# Altium footprint library 6-Connectors-3.PcbLib: 153 footprints (part 7 of 11)
Each footprint in its own frame and in the unit in brackets; x right, y up, seen from the top. Pads: shape width x height; smd on the part's side, far side on the other; paste and mask are expansions set on the pad; w line width, h text height; cw(c..) or ccw(c..) is an arc to the next point about the centre after c.
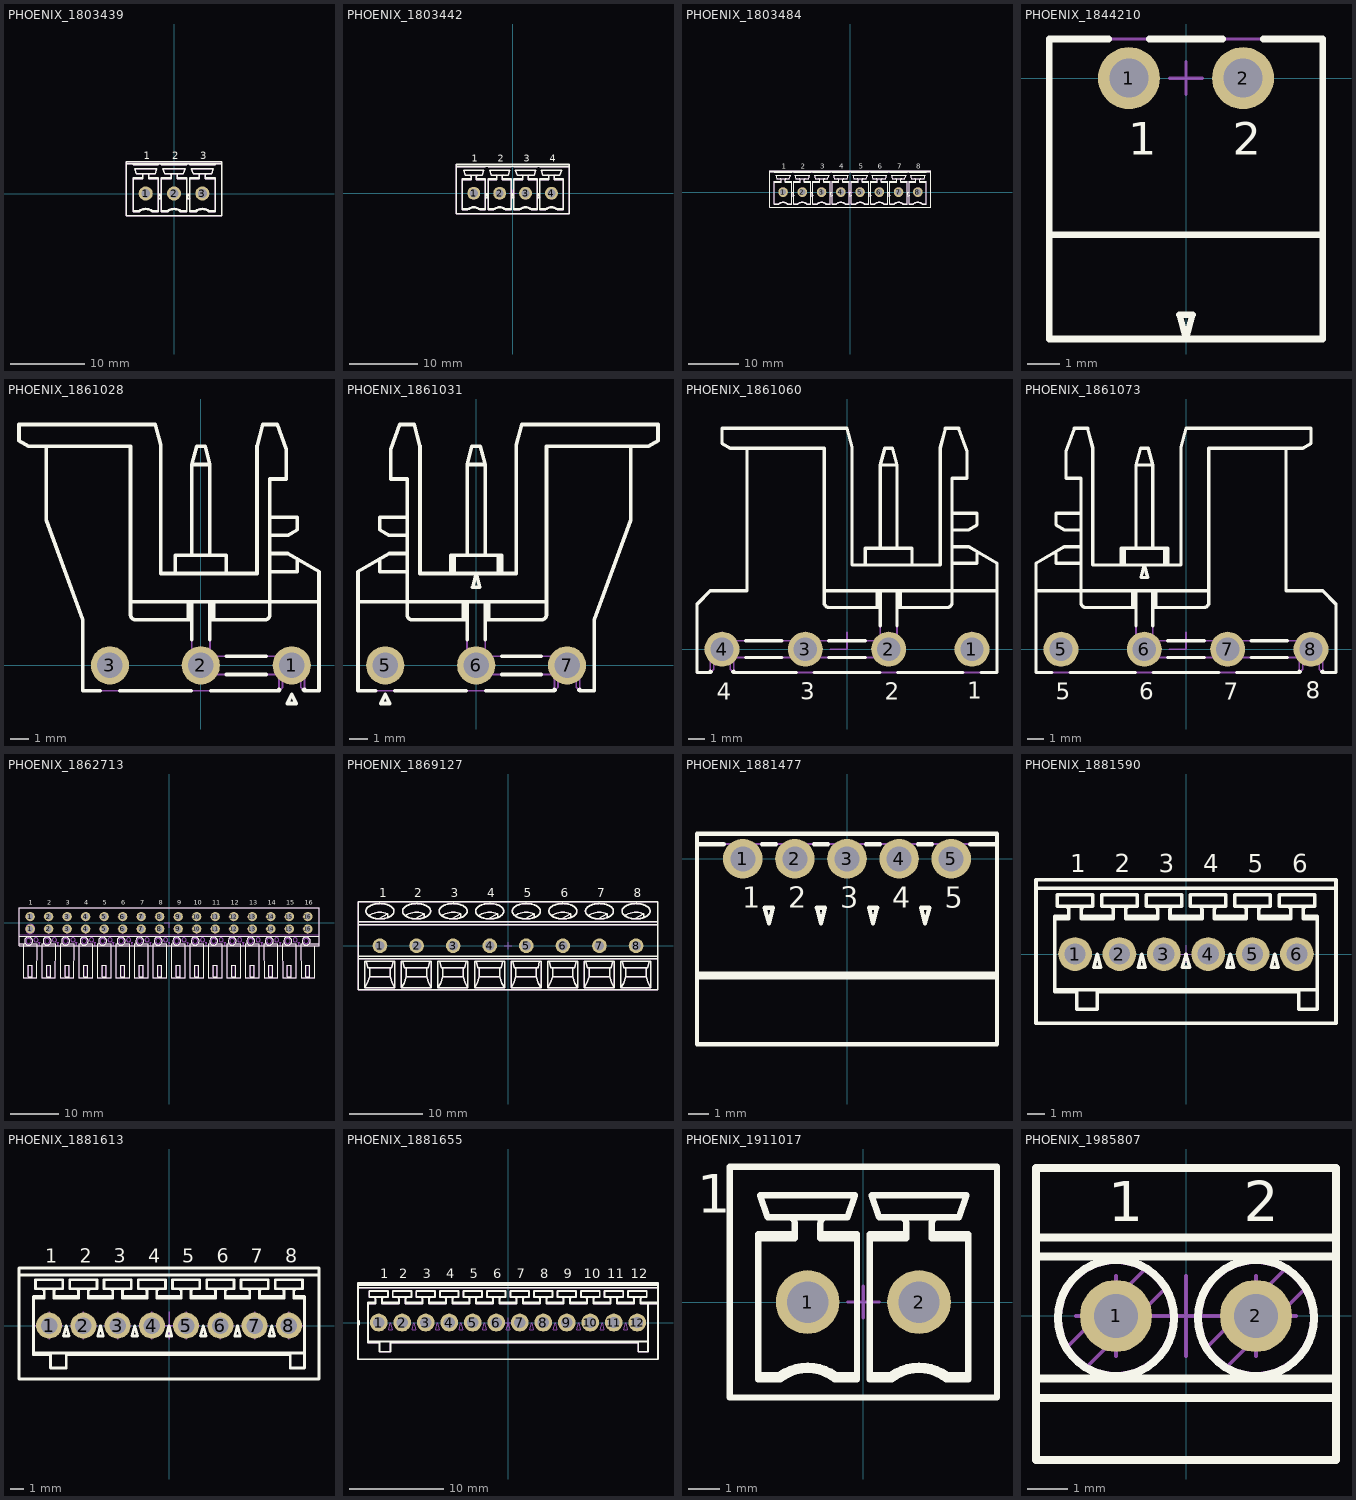
[diagram p6: the footprints below, top view; thin cyan lines are the x and y axes]

## PHOENIX_1803439 [mm] "PCB Header, 8A, 160 V, Pitch: 3.81mm, 3 Positions, MCV Serie"
height 9.2
pads (3):
  round 1.9 hole 1.2: 1(-3.81,0) 2(0,0) 3(3.81,0)
Top Overlay:
  lines w0.2: -6.41,4 6.41,4 ; -5.515,-2.3 -4.71,-2.3 ; -5.515,2 -4.21,2 -4.21,2.47 ccw(c-4.41,2.47) -4.41,2.67 ; -5.513,3.9 -5.514,3.9 ; -5.513,4 -5.514,4 -5.514,3.9 ; -4.21,2.134 -5.515,2.134 -5.515,-2.434 -4.664,-2.434 ; -3.41,2.134 -2.105,2.134 -2.105,-2.434 -2.956,-2.434 ; -3.21,2.67 ccw(c-3.21,2.47) -3.41,2.47 -3.41,2 -2.105,2 ; -2.106,4 -2.105,4 -2.105,3.9 -2.106,3.9 -5.514,3.9 ; -2.105,-2.3 -2.91,-2.3 ; -1.705,-2.3 -0.9,-2.3 ; -1.705,2 -0.4,2 -0.4,2.47 ccw(c-0.6,2.47) -0.6,2.67 ; -1.703,3.9 -1.704,3.9 ; -1.703,4 -1.704,4 -1.704,3.9 ; -0.4,2.134 -1.705,2.134 -1.705,-2.434 -0.854,-2.434 ; 0.4,2.134 1.705,2.134 1.705,-2.434 0.854,-2.434 ; 0.6,2.67 ccw(c0.6,2.47) 0.4,2.47 0.4,2 1.705,2 ; 1.704,4 1.705,4 1.705,3.9 1.704,3.9 -1.704,3.9 ; 1.705,-2.3 0.9,-2.3 ; 2.105,-2.3 2.91,-2.3 ; 2.105,2 3.41,2 3.41,2.47 ccw(c3.21,2.47) 3.21,2.67 ; 2.107,3.9 2.106,3.9 ; 2.107,4 2.106,4 2.106,3.9 ; 3.41,2.134 2.105,2.134 2.105,-2.434 2.956,-2.434 ; 4.21,2.134 5.515,2.134 5.515,-2.434 4.664,-2.434 ; 4.41,2.67 ccw(c4.41,2.47) 4.21,2.47 4.21,2 5.515,2 ; 5.514,4 5.515,4 5.515,3.9 5.514,3.9 2.106,3.9 ; 5.515,-2.3 4.71,-2.3 ; -4.71,-2.3 cw(c-3.81,-3.5) -2.91,-2.3 ; -4.71,-2.3 -4.699,-2.334 -4.687,-2.367 ccw(c3.361,0.384) -4.664,-2.434 ; -4.664,-2.434 cw(c-3.81,-3.5) -2.956,-2.434 ; -2.956,-2.434 -2.944,-2.401 -2.933,-2.367 ccw(c-11.642,0.61) -2.91,-2.3 ; -0.9,-2.3 cw(c0,-3.5) 0.9,-2.3 ; -0.9,-2.3 -0.889,-2.334 -0.877,-2.367 ccw(c7.171,0.384) -0.854,-2.434 ; -0.854,-2.434 cw(c0,-3.5) 0.854,-2.434 ; 0.854,-2.434 0.866,-2.401 0.877,-2.367 ccw(c-7.832,0.61) 0.9,-2.3 ; 2.91,-2.3 cw(c3.81,-3.5) 4.71,-2.3 ; 2.91,-2.3 2.921,-2.334 2.933,-2.367 ccw(c10.981,0.384) 2.956,-2.434 ; 2.956,-2.434 cw(c3.81,-3.5) 4.664,-2.434 ; 4.664,-2.434 4.676,-2.401 4.687,-2.367 ccw(c-4.022,0.61) 4.71,-2.3 ; -6.41,-3 6.41,-3 6.41,4.25 -6.41,4.25 -6.41,-3 ; -5.3,3.35 -2.32,3.35 -2.555,2.67 -5.065,2.67 -5.3,3.35 ; -2.093,-0.7 -1.717,-0.7 -1.905,0 -2.093,-0.7 ; -1.49,3.35 1.49,3.35 1.255,2.67 -1.255,2.67 -1.49,3.35 ; 1.717,-0.7 2.093,-0.7 1.905,0 1.717,-0.7 ; 2.32,3.35 5.3,3.35 5.065,2.67 2.555,2.67 2.32,3.35
  text "1" at -4.085,4.6 h1
  text "2" at -0.275,4.6 h1
  text "3" at 3.535,4.6 h1
Mechanical 2:
  circle w0.1: c0,0 r0.8
  circle w0.1: c3.81,0 r0.8
Mechanical 8:
  lines w0.1: -4.31,0 -3.81,0 ; -3.81,-0.5 -3.81,0 ; -3.81,0.5 -3.81,0 ; -3.31,0 -3.81,0 ; -0.5,0 0,0 ; 0,-0.5 0,0 ; 0,0.5 0,0 ; 0.5,0 0,0 ; 3.31,0 3.81,0 ; 3.81,-0.5 3.81,0 ; 3.81,0.5 3.81,0 ; 4.31,0 3.81,0
Mechanical 14:
  lines w0.1: -6.41,4 6.41,4 ; -5.515,-2.3 -4.71,-2.3 ; -5.515,2 -4.21,2 -4.21,2.47 ccw(c-4.41,2.47) -4.41,2.67 ; -5.513,3.9 -5.514,3.9 ; -5.513,4 -5.514,4 -5.514,3.9 ; -4.21,2.134 -5.515,2.134 -5.515,-2.434 -4.664,-2.434 ; -3.41,2.134 -2.105,2.134 -2.105,-2.434 -2.956,-2.434 ; -3.21,2.67 ccw(c-3.21,2.47) -3.41,2.47 -3.41,2 -2.105,2 ; -2.106,4 -2.105,4 -2.105,3.9 -2.106,3.9 -5.514,3.9 ; -2.105,-2.3 -2.91,-2.3 ; -1.705,-2.3 -0.9,-2.3 ; -1.705,2 -0.4,2 -0.4,2.47 ccw(c-0.6,2.47) -0.6,2.67 ; -1.703,3.9 -1.704,3.9 ; -1.703,4 -1.704,4 -1.704,3.9 ; -0.4,2.134 -1.705,2.134 -1.705,-2.434 -0.854,-2.434 ; 0.4,2.134 1.705,2.134 1.705,-2.434 0.854,-2.434 ; 0.6,2.67 ccw(c0.6,2.47) 0.4,2.47 0.4,2 1.705,2 ; 1.704,4 1.705,4 1.705,3.9 1.704,3.9 -1.704,3.9 ; 1.705,-2.3 0.9,-2.3 ; 2.105,-2.3 2.91,-2.3 ; 2.105,2 3.41,2 3.41,2.47 ccw(c3.21,2.47) 3.21,2.67 ; 2.107,3.9 2.106,3.9 ; 2.107,4 2.106,4 2.106,3.9 ; 3.41,2.134 2.105,2.134 2.105,-2.434 2.956,-2.434 ; 4.21,2.134 5.515,2.134 5.515,-2.434 4.664,-2.434 ; 4.41,2.67 ccw(c4.41,2.47) 4.21,2.47 4.21,2 5.515,2 ; 5.514,4 5.515,4 5.515,3.9 5.514,3.9 2.106,3.9 ; 5.515,-2.3 4.71,-2.3 ; -4.71,-2.3 cw(c-3.81,-3.5) -2.91,-2.3 ; -4.71,-2.3 -4.699,-2.334 -4.687,-2.367 ccw(c3.361,0.384) -4.664,-2.434 ; -4.664,-2.434 cw(c-3.81,-3.5) -2.956,-2.434 ; -2.956,-2.434 -2.944,-2.401 -2.933,-2.367 ccw(c-11.642,0.61) -2.91,-2.3 ; -0.9,-2.3 cw(c0,-3.5) 0.9,-2.3 ; -0.9,-2.3 -0.889,-2.334 -0.877,-2.367 ccw(c7.171,0.384) -0.854,-2.434 ; -0.854,-2.434 cw(c0,-3.5) 0.854,-2.434 ; 0.854,-2.434 0.866,-2.401 0.877,-2.367 ccw(c-7.832,0.61) 0.9,-2.3 ; 2.91,-2.3 cw(c3.81,-3.5) 4.71,-2.3 ; 2.91,-2.3 2.921,-2.334 2.933,-2.367 ccw(c10.981,0.384) 2.956,-2.434 ; 2.956,-2.434 cw(c3.81,-3.5) 4.664,-2.434 ; 4.664,-2.434 4.676,-2.401 4.687,-2.367 ccw(c-4.022,0.61) 4.71,-2.3 ; -6.41,-3 6.41,-3 6.41,4.25 -6.41,4.25 -6.41,-3 ; -5.3,3.35 -2.32,3.35 -2.555,2.67 -5.065,2.67 -5.3,3.35 ; -4.31,-0.625 ccw(c-3.81,0) -4.31,0.625 -4.31,-0.624 ; -4.21,-0.4 -4.21,0.4 -3.41,0.4 -3.41,-0.4 -4.21,-0.4 ; -2.093,-0.7 -1.717,-0.7 -1.905,0 -2.093,-0.7 ; -1.49,3.35 1.49,3.35 1.255,2.67 -1.255,2.67 -1.49,3.35 ; -0.4,-0.4 -0.4,0.4 0.4,0.4 0.4,-0.4 -0.4,-0.4 ; 1.717,-0.7 2.093,-0.7 1.905,0 1.717,-0.7 ; 2.32,3.35 5.3,3.35 5.065,2.67 2.555,2.67 2.32,3.35 ; 3.41,-0.4 3.41,0.4 4.21,0.4 4.21,-0.4 3.41,-0.4
3D body "PHOENIX_1803439.stp": height 9.2, standoff -3.4, extent -6.41,-3 6.41,4.25

## PHOENIX_1803442 [mm] "PCB Header, 8A, 160 V, Pitch: 3.81mm, 4 Positions, MCV Serie"
height 9.2
pads (4):
  round 1.9 hole 1.2: 1(-5.715,0) 2(-1.905,0) 3(1.905,0) 4(5.715,0)
Top Overlay:
  lines w0.2: -8.315,3.9 -4.011,3.9 -4.01,3.9 -4.01,4 -4.011,4 ; -8.315,4 8.315,4 ; -7.42,-2.3 -6.615,-2.3 ; -7.42,2 -6.115,2 -6.115,2.47 ccw(c-6.315,2.47) -6.315,2.67 ; -6.115,2.134 -7.42,2.134 -7.42,-2.434 -6.569,-2.434 ; -5.315,2.134 -4.01,2.134 -4.01,-2.434 -4.861,-2.434 ; -5.115,2.67 ccw(c-5.115,2.47) -5.315,2.47 -5.315,2 -4.01,2 ; -4.01,-2.3 -4.815,-2.3 ; -3.61,-2.3 -2.805,-2.3 ; -3.61,2 -2.305,2 -2.305,2.47 ccw(c-2.505,2.47) -2.505,2.67 ; -3.609,4 -3.61,4 -3.61,3.9 -3.609,3.9 -0.201,3.9 -0.2,3.9 -0.2,4 -0.201,4 ; -2.305,2.134 -3.61,2.134 -3.61,-2.434 -2.759,-2.434 ; -1.505,2.134 -0.2,2.134 -0.2,-2.434 -1.051,-2.434 ; -1.305,2.67 ccw(c-1.305,2.47) -1.505,2.47 -1.505,2 -0.2,2 ; -0.2,-2.3 -1.005,-2.3 ; 0.2,-2.3 1.005,-2.3 ; 0.2,2 1.505,2 1.505,2.47 ccw(c1.305,2.47) 1.305,2.67 ; 0.201,4 0.2,4 0.2,3.9 0.201,3.9 3.609,3.9 3.61,3.9 3.61,4 3.609,4 ; 1.505,2.134 0.2,2.134 0.2,-2.434 1.051,-2.434 ; 2.305,2.134 3.61,2.134 3.61,-2.434 2.759,-2.434 ; 2.505,2.67 ccw(c2.505,2.47) 2.305,2.47 2.305,2 3.61,2 ; 3.61,-2.3 2.805,-2.3 ; 4.01,-2.3 4.815,-2.3 ; 4.01,2 5.315,2 5.315,2.47 ccw(c5.115,2.47) 5.115,2.67 ; 4.011,4 4.01,4 4.01,3.9 4.011,3.9 8.315,3.9 ; 5.315,2.134 4.01,2.134 4.01,-2.434 4.861,-2.434 ; 6.115,2.134 7.42,2.134 7.42,-2.434 6.569,-2.434 ; 6.315,2.67 ccw(c6.315,2.47) 6.115,2.47 6.115,2 7.42,2 ; 7.42,-2.3 6.615,-2.3 ; -6.615,-2.3 cw(c-5.715,-3.5) -4.815,-2.3 ; -6.615,-2.3 -6.604,-2.334 -6.592,-2.367 ccw(c1.456,0.384) -6.569,-2.434 ; -6.569,-2.434 cw(c-5.715,-3.5) -4.861,-2.434 ; -4.861,-2.434 -4.849,-2.401 -4.838,-2.367 ccw(c-13.547,0.61) -4.815,-2.3 ; -2.805,-2.3 cw(c-1.905,-3.5) -1.005,-2.3 ; -2.805,-2.3 -2.794,-2.334 -2.782,-2.367 ccw(c5.266,0.384) -2.759,-2.434 ; -2.759,-2.434 cw(c-1.905,-3.5) -1.051,-2.434 ; -1.051,-2.434 -1.039,-2.401 -1.028,-2.367 ccw(c-9.737,0.61) -1.005,-2.3 ; 1.005,-2.3 cw(c1.905,-3.5) 2.805,-2.3 ; 1.005,-2.3 1.016,-2.334 1.028,-2.367 ccw(c9.05,0.375) 1.051,-2.434 ; 1.051,-2.434 cw(c1.905,-3.5) 2.759,-2.434 ; 2.759,-2.434 2.771,-2.401 2.782,-2.367 ccw(c-5.968,0.624) 2.805,-2.3 ; 4.815,-2.3 cw(c5.715,-3.5) 6.615,-2.3 ; 4.815,-2.3 4.826,-2.334 4.838,-2.367 ccw(c12.886,0.384) 4.861,-2.434 ; 4.861,-2.434 cw(c5.715,-3.5) 6.569,-2.434 ; 6.569,-2.434 6.581,-2.401 6.592,-2.367 ccw(c-2.117,0.61) 6.615,-2.3 ; -8.315,-3 -8.315,4.25 8.315,4.25 8.315,-3 -8.315,-3 ; -7.205,3.35 -6.97,2.67 -4.46,2.67 -4.225,3.35 -7.205,3.35 ; -3.998,-0.7 -3.81,0 -3.622,-0.7 -3.998,-0.7 ; -3.395,3.35 -3.16,2.67 -0.65,2.67 -0.415,3.35 -3.395,3.35 ; -0.188,-0.7 0,0 0.188,-0.7 -0.188,-0.7 ; 0.415,3.35 0.65,2.67 3.16,2.67 3.395,3.35 0.415,3.35 ; 3.622,-0.7 3.81,0 3.998,-0.7 3.622,-0.7 ; 4.225,3.35 7.205,3.35 6.97,2.67 4.46,2.67 4.225,3.35
  text "1" at -5.99,4.6 h1
  text "2" at -2.18,4.6 h1
  text "3" at 1.63,4.6 h1
  text "4" at 5.44,4.6 h1
Mechanical 8:
  lines w0.1: -6.215,0 -5.715,0 ; -5.715,-0.5 -5.715,0 ; -5.715,0.5 -5.715,0 ; -5.215,0 -5.715,0 ; -2.405,0 -1.905,0 ; -1.905,-0.5 -1.905,0 ; -1.905,0.5 -1.905,0 ; -1.405,0 -1.905,0 ; -0.5,0 0,0 ; 0,-0.5 0,0 ; 0,0.5 0,0 ; 0.5,0 0,0 ; 1.405,0 1.905,0 ; 1.905,-0.5 1.905,0 ; 1.905,0.5 1.905,0 ; 2.405,0 1.905,0 ; 5.215,0 5.715,0 ; 5.715,-0.5 5.715,0 ; 5.715,0.5 5.715,0 ; 6.215,0 5.715,0
Mechanical 14:
  drawing of 161 lines, arcs and shapes, not listed
3D body "PHOENIX_1803442.stp": height 9.2, standoff -3.4, extent -8.315,-3 8.315,4.25

## PHOENIX_1803484 [mm] "PCB Header, 8A, 160 V, Pitch: 3.81mm, 8 Positions, MCV Serie"
height 9.2
pads (8):
  round 1.9 hole 1.2: 1(-13.335,0) 2(-9.525,0) 3(-5.715,0) 4(-1.905,0) 5(1.905,0) 6(5.715,0) 7(9.525,0) 8(13.335,0)
Top Overlay:
  drawing of 290 lines, arcs and shapes, not listed
  text "8" at 13.06,4.6 h1
  text "7" at 9.25,4.6 h1
  text "1" at -13.61,4.6 h1
  text "2" at -9.8,4.6 h1
  text "3" at -5.99,4.6 h1
  text "4" at -2.18,4.6 h1
  text "5" at 1.63,4.6 h1
  text "6" at 5.44,4.6 h1
Mechanical 8:
  lines w0.1: -13.835,0 -13.335,0 ; -13.335,-0.5 -13.335,0 ; -13.335,0.5 -13.335,0 ; -12.835,0 -13.335,0 ; -10.025,0 -9.525,0 ; -9.525,-0.5 -9.525,0 ; -9.525,0.5 -9.525,0 ; -9.025,0 -9.525,0 ; -6.215,0 -5.715,0 ; -5.715,-0.5 -5.715,0 ; -5.715,0.5 -5.715,0 ; -5.215,0 -5.715,0 ; -2.405,0 -1.905,0 ; -1.905,-0.5 -1.905,0 ; -1.905,0.5 -1.905,0 ; -1.405,0 -1.905,0 ; -0.5,0 0,0 ; 0,-0.5 0,0 ; 0,0.5 0,0 ; 0.5,0 0,0 ; 1.405,0 1.905,0 ; 1.905,-0.5 1.905,0 ; 1.905,0.5 1.905,0 ; 2.405,0 1.905,0 ; 5.215,0 5.715,0 ; 5.715,-0.5 5.715,0 ; 5.715,0.5 5.715,0 ; 6.215,0 5.715,0 ; 9.025,0 9.525,0 ; 9.525,-0.5 9.525,0 ; 9.525,0.5 9.525,0 ; 10.025,0 9.525,0 ; 12.835,0 13.335,0 ; 13.335,-0.5 13.335,0 ; 13.335,0.5 13.335,0 ; 13.835,0 13.335,0
Mechanical 14:
  drawing of 492 lines, arcs and shapes, not listed
3D body "PHOENIX_1803484.stp": height 9.2, standoff -3.4, extent -15.935,-3 15.935,4.25

## PHOENIX_1844210 [mm] "PHOENIX MC Serie, Pitch 3.5mm, 8A, 160V, 2 Positions Header"
height 8.1
pads (2):
  round 1.9 hole 1.2: 1(-1.75,0) 2(1.75,0)
Top Overlay:
  lines w0.2: -4.2,-4.8 4.2,-4.8 ; -2.368,1.2 -4.2,1.2 -4.2,-8 4.2,-8 4.2,1.2 2.368,1.2 ; -1.132,1.2 1.132,1.2 ; -0.201,-7.25 0,-8 0.201,-7.25 -0.201,-7.25
  text "2" at 1.433,-2.35 h1
  text "1" at -1.767,-2.35 h1
Mechanical 8:
  lines w0.1: -2.25,0 -1.75,0 ; -1.75,-0.5 -1.75,0 ; -1.75,0.5 -1.75,0 ; -1.25,0 -1.75,0 ; -0.5,0 0,0 ; 0,-0.5 0,0 ; 0,0.5 0,0 ; 0.5,0 0,0 ; 1.25,0 1.75,0 ; 1.75,-0.5 1.75,0 ; 1.75,0.5 1.75,0 ; 2.25,0 1.75,0
Mechanical 14:
  lines w0.1: -4.2,-4.8 4.2,-4.8 ; -4.2,-8 4.2,-8 4.2,1.2 -4.2,1.2 -4.2,-8 ; -0.201,-7.25 0,-8 0.201,-7.25 -0.201,-7.25
3D body "PHOENIX_1844210.stp": height 7.25, standoff -3.4, extent -4.2,-8 4.2,1.2

## PHOENIX_1861028 [mm] "COMBICON PCB Male Header, Pitch 5mm, 3 Positions, Left"
height 11
pads (3):
  round 2.1 hole 1.4: 1(5,0) 2(0,0) 3(-5,0)
Top Overlay:
  lines w0.2: -8.5,12.05 -8.5,7.995 -6.5,2.5 -6.5,-1.4 -5.539,-1.4 ; -4.461,-1.4 -0.539,-1.4 ; -3.87,3.5 6.5,3.5 ; -1.4,5.05 -1.4,6.05 1.4,6.05 1.4,5.05 ; -0.7,3.5 -0.7,2.5 -0.5,2.7 ; -0.5,1.414 -0.5,3.5 ; -0.5,2.5 -3.57,2.5 cw(c-3.57,2.8) -3.87,2.8 -3.87,12.05 -9.48,12.05 -10,12.35 -10,13.25 -2.5,13.25 -2.2,12.13 -2.2,5.05 3.093,5.05 3.093,12.087 3.405,13.25 4.2,13.25 4.7,11.876 4.7,10.25 3.8,10.25 3.8,2.8 cw(c3.5,2.8) 3.5,2.5 0.5,2.5 ; -0.5,6.05 -0.5,11.05 ; 0.5,1.414 0.5,3.5 ; 0.5,2.7 0.7,2.5 0.7,3.5 ; 0.5,6.05 0.5,11.05 ; 0.539,-1.4 4.3,-1.4 ; 1.414,-0.5 3.586,-0.5 ; 1.414,0.5 3.586,0.5 ; 3.8,5.15 5.3,5.15 5.3,5.85 ; 3.8,6.15 4.78,6.15 6.5,5.157 6.5,-1.4 5.7,-1.4 ; 3.8,7.15 4.78,7.15 5.3,7.45 5.3,8.15 3.8,8.15 ; 4.3,-1.327 4.3,-1.4 ; 4.349,-1.351 4.3,-1.4 ; 5.651,-1.351 5.7,-1.4 ; 5.7,-1.327 5.7,-1.4 ; -0.5,11.05 0.5,11.05 ; -0.5,11.05 -0.232,12.05 0.232,12.05 0.5,11.05 ; 4.75,-2.1 5.25,-2.1 5,-1.6 4.75,-2.1
Mechanical 8:
  lines w0.1: -6,0 -5,0 -5,1 ; -1,0 0,0 0,1 ; 4,0 5,0 5,1
Mechanical 14:
  lines w0.1: -8.5,12.05 -8.5,7.995 -6.5,2.5 -6.5,-1.4 4.3,-1.4 ; -3.87,3.5 6.5,3.5 ; -1.4,5.05 -1.4,6.05 1.4,6.05 1.4,5.05 ; -0.7,3.5 -0.7,2.5 -0.5,2.7 ; -0.5,2.5 -3.57,2.5 cw(c-3.57,2.8) -3.87,2.8 -3.87,12.05 -9.48,12.05 -10,12.35 -10,13.25 -2.5,13.25 -2.2,12.13 -2.2,5.05 3.093,5.05 3.093,12.087 3.405,13.25 4.2,13.25 4.7,11.876 4.7,10.25 3.8,10.25 3.8,2.8 cw(c3.5,2.8) 3.5,2.5 0.5,2.5 ; -0.5,3.5 -0.5,0.7 ccw(c0.7,0.7) 0.7,-0.5 5.5,-0.5 ; -0.5,6.05 -0.5,11.05 ; 0.5,2.7 0.7,2.5 0.7,3.5 ; 0.5,3.5 0.5,0.7 ccw(c0.7,0.7) 0.7,0.5 5.5,0.5 ; 0.5,6.05 0.5,11.05 ; 3.8,5.15 5.3,5.15 5.3,5.85 ; 3.8,6.15 4.78,6.15 6.5,5.157 6.5,-1.4 5.7,-1.4 ; 3.8,7.15 4.78,7.15 5.3,7.45 5.3,8.15 3.8,8.15 ; 4.5,-0.5 4.5,-1.2 4.3,-1.4 ; 4.5,0.5 4.3,0.7 ; -0.5,11.05 0.5,11.05 ; -0.5,11.05 -0.232,12.05 0.232,12.05 0.5,11.05 ; 4.3,-1.4 4.3,0.7 ; 4.3,0.7 5.7,0.7 ; 5.5,0.5 5.5,-1.2 5.7,-1.4 ; 5.5,0.5 5.7,0.7 ; 5.7,-1.4 5.7,0.7
3D body "PHOENIX_1861028.stp": height 10.97, standoff -3.98, extent -10,-1.4 6.5,13.25

## PHOENIX_1861031 [mm] "COMBICON PCB Male Header, Pitch 5mm, 3 Positions, Right"
height 11
pads (3):
  round 2.1 hole 1.4: 5(-5,0) 6(0,0) 7(5,0)
Top Overlay:
  lines w0.2: -6.5,3.5 3.87,3.5 ; -5.539,-1.4 -6.5,-1.4 -6.5,5.157 -4.78,6.15 -3.8,6.15 ; -5.3,5.85 -5.3,5.15 -3.8,5.15 ; -4.461,-1.4 -0.539,-1.4 ; -3.8,7.15 -4.78,7.15 -5.3,7.45 -5.3,8.15 -3.8,8.15 ; -1.4,5.05 -1.4,6.05 1.4,6.05 1.4,5.05 ; -1.212,5.05 -1.212,6.05 ; -0.7,3.5 -0.7,2.5 -0.5,2.7 ; -0.5,1.414 -0.5,3.5 ; -0.5,2.5 -3.5,2.5 cw(c-3.5,2.8) -3.8,2.8 -3.8,10.25 -4.7,10.25 -4.7,11.876 -4.2,13.25 -3.405,13.25 -3.093,12.087 -3.093,5.05 2.2,5.05 2.2,12.13 2.5,13.25 10,13.25 10,12.35 9.48,12.05 3.87,12.05 3.87,2.8 cw(c3.57,2.8) 3.57,2.5 0.5,2.5 ; -0.5,6.05 -0.5,11.05 ; 0.5,1.414 0.5,3.5 ; 0.5,2.7 0.7,2.5 0.7,3.5 ; 0.5,6.05 0.5,11.05 ; 0.539,-1.4 4.3,-1.4 ; 1.212,5.05 1.212,6.05 ; 1.414,-0.5 3.586,-0.5 ; 1.414,0.5 3.586,0.5 ; 4.3,-1.327 4.3,-1.4 ; 4.349,-1.351 4.3,-1.4 ; 5.651,-1.351 5.7,-1.4 ; 5.7,-1.327 5.7,-1.4 ; 8.5,12.05 8.5,7.995 6.5,2.5 6.5,-1.4 5.7,-1.4 ; -0.5,11.05 -0.232,12.05 0.232,12.05 0.5,11.05 ; -0.5,11.05 0.5,11.05 ; -5.25,-2.1 -5,-1.6 -4.75,-2.1 -5.25,-2.1 ; -0.201,4.3 0,5.05 0.201,4.3 -0.201,4.3
Mechanical 8:
  lines w0.1: -5,-1 -5,0 -4,0 ; 0,-1 0,0 1,0 ; 5,-1 5,0 6,0
Mechanical 14:
  lines w0.1: -6.5,3.5 3.87,3.5 ; -5.3,5.85 -5.3,5.15 -3.8,5.15 ; -3.8,6.15 -4.78,6.15 -6.5,5.157 -6.5,-1.4 4.3,-1.4 ; -3.8,7.15 -4.78,7.15 -5.3,7.45 -5.3,8.15 -3.8,8.15 ; -1.4,5.05 -1.4,6.05 1.4,6.05 1.4,5.05 ; -1.212,5.05 -1.212,6.05 ; -0.7,3.5 -0.7,2.5 -0.5,2.7 ; -0.5,2.5 -3.5,2.5 cw(c-3.5,2.8) -3.8,2.8 -3.8,10.25 -4.7,10.25 -4.7,11.876 -4.2,13.25 -3.405,13.25 -3.093,12.087 -3.093,5.05 2.2,5.05 2.2,12.13 2.5,13.25 10,13.25 10,12.35 9.48,12.05 3.87,12.05 3.87,2.8 cw(c3.57,2.8) 3.57,2.5 0.5,2.5 ; -0.5,3.5 -0.5,0.7 ccw(c0.7,0.7) 0.7,-0.5 5.5,-0.5 ; -0.5,6.05 -0.5,11.05 ; 0.5,2.7 0.7,2.5 0.7,3.5 ; 0.5,3.5 0.5,0.7 ccw(c0.7,0.7) 0.7,0.5 5.5,0.5 ; 0.5,6.05 0.5,11.05 ; 1.212,5.05 1.212,6.05 ; 4.5,-0.5 4.5,-1.2 4.3,-1.4 ; 4.5,0.5 4.3,0.7 ; 8.5,12.05 8.5,7.995 6.5,2.5 6.5,-1.4 5.7,-1.4 ; -0.5,11.05 -0.232,12.05 0.232,12.05 0.5,11.05 ; -0.5,11.05 0.5,11.05 ; 4.3,-1.4 4.3,0.7 ; 4.3,0.7 5.7,0.7 ; 5.5,0.5 5.7,0.7 ; 5.5,0.5 5.5,-1.2 5.7,-1.4 ; 5.7,-1.4 5.7,0.7 ; -0.201,4.3 0,5.05 0.201,4.3 -0.201,4.3
3D body "PHOENIX_1861031.stp": height 10.97, standoff -3.98, extent -6.5,-1.4 10,13.25

## PHOENIX_1861060 [mm] "COMBICON PCB Male Header, Pitch 5mm, 4 Positions, Left"
height 16
pads (4):
  round 2.1 hole 1.4: 1(7.5,0) 2(2.5,0) 3(-2.5,0) 4(-7.5,0)
Top Overlay:
  lines w0.2: -8.2,-1.327 -8.2,-1.4 ; -8.151,-1.351 -8.2,-1.4 ; -6.849,-1.351 -6.8,-1.4 ; -6.8,-1.327 -6.8,-1.4 ; -6.086,-0.5 -3.914,-0.5 ; -6.086,0.5 -3.914,0.5 ; -6,12.05 -6,3.5 -8.2,3.5 -9,2.7 -9,-1.4 -8.2,-1.4 ; -3.039,-1.4 -6.8,-1.4 ; -1.961,-1.4 1.961,-1.4 ; -1.37,3.5 9,3.5 ; -1.086,-0.5 1.086,-0.5 ; -1.086,0.5 1.086,0.5 ; 1.1,5.05 1.1,6.05 3.9,6.05 3.9,5.05 ; 1.8,3.5 1.8,2.5 2,2.7 ; 2,1.414 2,3.5 ; 2,2.5 -1.07,2.5 cw(c-1.07,2.8) -1.37,2.8 -1.37,12.05 -6.98,12.05 -7.5,12.35 -7.5,13.25 0,13.25 0.3,12.13 0.3,5.05 5.593,5.05 5.593,12.087 5.905,13.25 6.7,13.25 7.2,11.876 7.2,10.25 6.3,10.25 6.3,2.8 cw(c6,2.8) 6,2.5 3,2.5 ; 2,6.05 2,11.05 ; 3,1.414 3,3.5 ; 3,2.7 3.2,2.5 3.2,3.5 ; 3,6.05 3,11.05 ; 3.039,-1.4 6.961,-1.4 ; 6.3,5.15 7.8,5.15 7.8,5.85 ; 6.3,6.15 7.28,6.15 9,5.157 9,-1.4 8.039,-1.4 ; 6.3,7.15 7.28,7.15 7.8,7.45 7.8,8.15 6.3,8.15 ; 2,11.05 3,11.05 ; 2,11.05 2.268,12.05 2.732,12.05 3,11.05
  text "1" at 7.2,-2.972 h1
  text "4" at -7.825,-3.025 h1
  text "3" at -2.8,-3.025 h1
  text "2" at 2.25,-3.025 h1
Mechanical 8:
  lines w0.1: -8.5,0 -7.5,0 -7.5,1 ; -3.5,0 -2.5,0 -2.5,1 ; -1,0 0,0 0,1 ; 1.5,0 2.5,0 2.5,1 ; 6.5,0 7.5,0 7.5,1
Mechanical 14:
  lines w0.1: -8,-0.5 1.8,-0.5 ccw(c1.8,0.7) 3,0.7 3,3.5 ; -7,-0.5 -7,-1.2 -6.8,-1.4 ; -7,0.5 -6.8,0.7 ; -6.8,-0.5 -6.8,-1.4 ; -6.8,0.5 -6.8,0.7 ; -6,12.05 -6,3.5 -8.2,3.5 -9,2.7 -9,-1.4 -8.2,-1.4 ; -1.37,3.5 9,3.5 ; 1.1,5.05 1.1,6.05 3.9,6.05 3.9,5.05 ; 1.8,3.5 1.8,2.5 2,2.7 ; 2,2.5 -1.07,2.5 cw(c-1.07,2.8) -1.37,2.8 -1.37,12.05 -6.98,12.05 -7.5,12.35 -7.5,13.25 0,13.25 0.3,12.13 0.3,5.05 5.593,5.05 5.593,12.087 5.905,13.25 6.7,13.25 7.2,11.876 7.2,10.25 6.3,10.25 6.3,2.8 cw(c6,2.8) 6,2.5 3,2.5 ; 2,3.5 2,0.7 cw(c1.8,0.7) 1.8,0.5 -8,0.5 ; 2,6.05 2,11.05 ; 3,2.7 3.2,2.5 3.2,3.5 ; 3,6.05 3,11.05 ; 6.3,5.15 7.8,5.15 7.8,5.85 ; 6.3,6.15 7.28,6.15 9,5.157 9,-1.4 -6.8,-1.4 ; 6.3,7.15 7.28,7.15 7.8,7.45 7.8,8.15 6.3,8.15 ; -8.2,-1.4 -8,-1.2 -8,0.5 ; -8.2,-1.4 -8.2,0.7 ; -8.2,0.7 -6.8,0.7 ; -8.2,0.7 -8,0.5 ; 2,11.05 3,11.05 ; 2,11.05 2.268,12.05 2.732,12.05 3,11.05
  text "2" at 2.25,-3.025 h1
  text "3" at -2.8,-3.025 h1
  text "4" at -7.825,-3.025 h1
  text "1" at 7.2,-2.972 h1
3D body "PHOENIX_1861060.stp": height 15.97, standoff -3.98, extent -9,-1.4 9,13.25
